# Altium footprint library SMT.PcbLib: 379 footprints (part 10 of 24)
Each footprint in its own frame and in the unit in brackets; x right, y up, seen from the top. Pads: shape width x height; smd on the part's side, far side on the other; paste and mask are expansions set on the pad; w line width, h text height; cw(c..) or ccw(c..) is an arc to the next point about the centre after c.
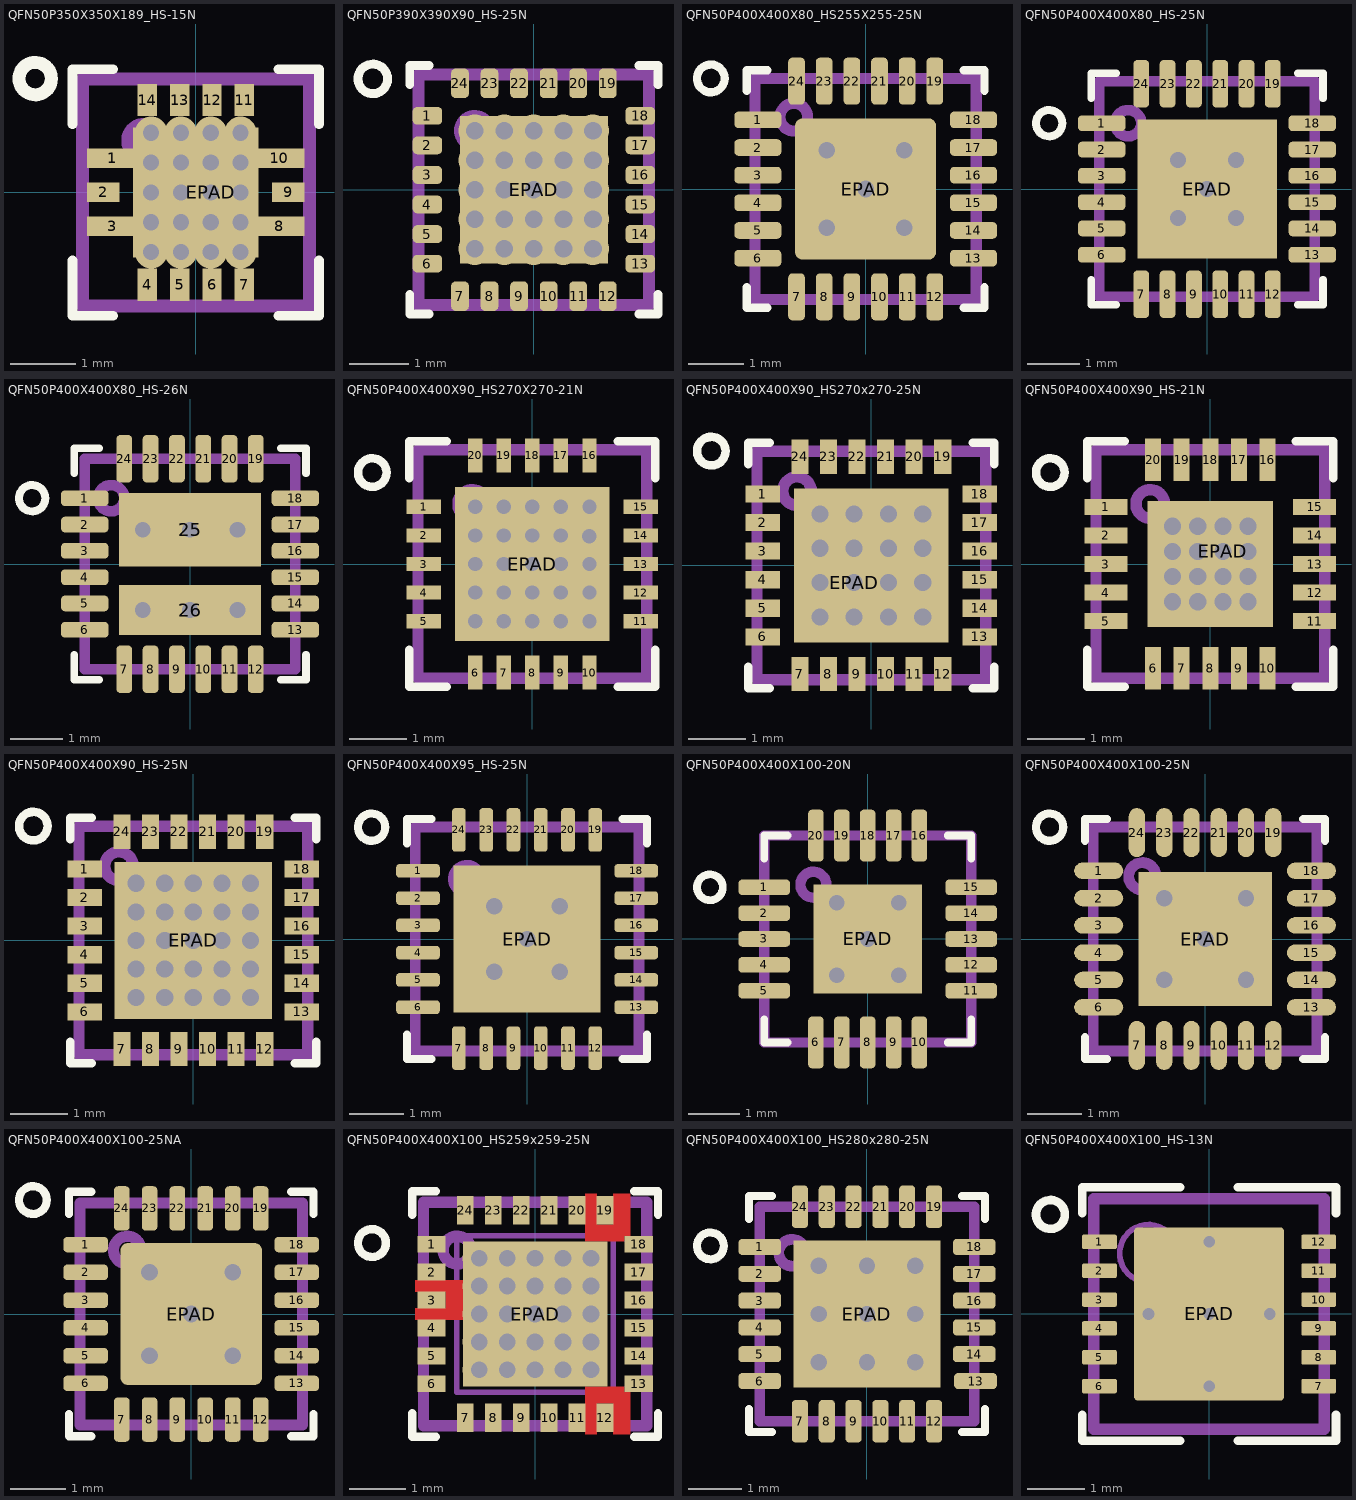
[diagram p9: the footprints below, top view; thin cyan lines are the x and y axes]

## QFN50P350X350X189_HS-15N [mm] "QFN, 14-Leads, Body 3,50x3,50mm, Pitch 0,50mm/0,53mm, Thermal Pad 1,90x2,00mm, IPC Medium Density"
height 1.89
pads (15):
  rect 0.78x0.3 smd paste+0 mask+0.05: 1(-1.285,0.525) 3(-1.285,-0.525) 8(1.285,-0.525) 10(1.285,0.525)
  rect 0.5x0.3 smd paste+0 mask+0.05: 2(-1.425,0) 9(1.425,0)
  rect 0.3x0.5 smd paste+0 mask+0.05: 4(-0.75,-1.425) 5(-0.25,-1.425) 6(0.25,-1.425) 7(0.75,-1.425) 11(0.75,1.425) 12(0.25,1.425) 13(-0.25,1.425) 14(-0.75,1.425)
  rect 1.93x2 hole 0.25 copper offset -0.23,0 mask+0.05: EPAD(0.23,0)
via 0.69,0.92 diameter 0.5 hole 0.25
via 0.23,0.92 diameter 0.5 hole 0.25
via -0.23,0.92 diameter 0.5 hole 0.25
via -0.69,0.92 diameter 0.5 hole 0.25
via 0.69,-0.92 diameter 0.5 hole 0.25
via 0.23,-0.92 diameter 0.5 hole 0.25
via -0.23,-0.92 diameter 0.5 hole 0.25
via -0.69,-0.92 diameter 0.5 hole 0.25
via -0.69,-0.46 diameter 0.5 hole 0.25
via 0.69,-0.46 diameter 0.5 hole 0.25
via 0.23,-0.46 diameter 0.5 hole 0.25
via -0.23,-0.46 diameter 0.5 hole 0.25
via -0.69,0.46 diameter 0.5 hole 0.25
via -0.23,0.46 diameter 0.5 hole 0.25
via 0.23,0.46 diameter 0.5 hole 0.25
via 0.69,0.46 diameter 0.5 hole 0.25
via 0.69,0 diameter 0.5 hole 0.25
via -0.69,0 diameter 0.5 hole 0.25
via -0.23,0 diameter 0.5 hole 0.25
Top Overlay:
  circle w0.2: c-2.476,1.755 r0.25
  lines w0.15: -1.9,-1.05 -1.9,-1.9 -1.275,-1.9 ; -1.9,1.05 -1.9,1.9 -1.275,1.9 ; 1.275,-1.9 1.9,-1.9 1.9,-1.05 ; 1.275,1.9 1.9,1.9 1.9,1.05
Top Paste:
  rectangle: -0.25,-0.25 0.25,0.25
  rectangle: -0.9,-0.25 -0.4,0.25
  region: 0.9,0.25 0.4,0.25 0.4,-0.25 0.9,-0.25
  region: -0.25,0.9 -0.25,0.4 0.25,0.4 0.25,0.9
  region: 0.25,-0.9 0.25,-0.4 -0.25,-0.4 -0.25,-0.9
  region: -0.9,0.9 -0.9,0.4 -0.4,0.4 -0.4,0.9
  region: 0.4,0.9 0.4,0.4 0.9,0.4 0.9,0.9
  region: 0.9,-0.9 0.9,-0.4 0.4,-0.4 0.4,-0.9
  region: -0.4,-0.9 -0.4,-0.4 -0.9,-0.4 -0.9,-0.9
Mechanical 1:
  circle w0.2: c-0.8,0.8 r0.25
  lines w0.2: -1.75,-1.75 1.75,-1.75 1.75,1.75 -1.75,1.75 -1.75,-1.75
Mechanical 20:
  text "см. рекомендации /  в datasheet /  /  /  /  / прошивка  / под 0.5 oz Cu и RO4003C (0.008\")" at -4.9,-5.775 h1.5
3D body "QFN50P350X350X189_HS-15N.step": height 1.89, standoff 0, extent -1.75,-1.75 1.75,1.75

## QFN50P390X390X90_HS-25N [mm] "QFN, 24-Leads, Body 3,90x3,90mm, Pitch 0,50mm, Thermal Pad 2,50x2,50mm, IPC Medium Density"
height 0.9
pads (25):
  rrect50% 0.5x0.3 smd mask+0.05: 1(-1.8,1.25) 2(-1.8,0.75) 3(-1.8,0.25) 4(-1.8,-0.25) 5(-1.8,-0.75) 6(-1.8,-1.25) 13(1.8,-1.25) 14(1.8,-0.75) 15(1.8,-0.25) 16(1.8,0.25) 17(1.8,0.75) 18(1.8,1.25)
  rrect50% 0.3x0.5 smd mask+0.05: 7(-1.25,-1.8) 8(-0.75,-1.8) 9(-0.25,-1.8) 10(0.25,-1.8) 11(0.75,-1.8) 12(1.25,-1.8) 19(1.25,1.8) 20(0.75,1.8) 21(0.25,1.8) 22(-0.25,1.8) 23(-0.75,1.8) 24(-1.25,1.8)
  rect 2.5x2.5 hole 0.3 mask+0.05: EPAD(0,0)
via 1,-1 diameter 0.55 hole 0.3
via 0.5,-1 diameter 0.55 hole 0.3
via 0,-1 diameter 0.55 hole 0.3
via -0.5,-1 diameter 0.55 hole 0.3
via -1,-1 diameter 0.55 hole 0.3
via -1,-0.5 diameter 0.55 hole 0.3
via -1,1 diameter 0.55 hole 0.3
via -0.5,1 diameter 0.55 hole 0.3
via 0,1 diameter 0.55 hole 0.3
via -0.5,-0.5 diameter 0.55 hole 0.3
via 0,-0.5 diameter 0.55 hole 0.3
via 0.5,-0.5 diameter 0.55 hole 0.3
via 1,-0.5 diameter 0.55 hole 0.3
via 0.5,1 diameter 0.55 hole 0.3
via 1,1 diameter 0.55 hole 0.3
via 1,0 diameter 0.55 hole 0.3
via 0.5,0 diameter 0.55 hole 0.3
via 1,0.5 diameter 0.55 hole 0.3
via 0.5,0.5 diameter 0.55 hole 0.3
via 0,0.5 diameter 0.55 hole 0.3
via -1,0.5 diameter 0.55 hole 0.3
via -0.5,0.5 diameter 0.55 hole 0.3
via -1,0 diameter 0.55 hole 0.3
via -0.5,0 diameter 0.55 hole 0.3
Top Overlay:
  circle w0.15: c-2.725,1.875 r0.25
  lines w0.15: -2.1,-1.775 -2.1,-2.1 -1.775,-2.1 ; -2.1,1.775 -2.1,2.1 -1.775,2.1 ; 1.775,-2.1 2.1,-2.1 2.1,-1.775 ; 1.775,2.1 2.1,2.1 2.1,1.775
Top Paste:
  rectangle: -0.75,-0.75 0.75,0.75
Mechanical 1:
  circle w0.2: c-1,1 r0.25
  lines w0.2: -1.95,-1.95 -1.95,1.95 1.95,1.95 1.95,-1.95 -1.95,-1.95
3D body "QFN50P390X390X90_HS-25N.step": height 0.9, standoff 0, extent -1.95,-1.95 1.95,1.95

## QFN50P400X400X80_HS255X255-25N [mm] "QFN, 24-Leads, Body 4,00x4,00mm, Pitch 0,50mm, Thermal Pad 2,55x2,55mm, IPC Medium Density"
height 0.8
pads (25):
  rrect50% 0.85x0.3 smd mask+0.04: 1(-1.95,1.25) 2(-1.95,0.75) 3(-1.95,0.25) 4(-1.95,-0.25) 5(-1.95,-0.75) 6(-1.95,-1.25) 13(1.95,-1.25) 14(1.95,-0.75) 15(1.95,-0.25) 16(1.95,0.25) 17(1.95,0.75) 18(1.95,1.25)
  rrect50% 0.3x0.85 smd mask+0.04: 7(-1.25,-1.95) 8(-0.75,-1.95) 9(-0.25,-1.95) 10(0.25,-1.95) 11(0.75,-1.95) 12(1.25,-1.95) 19(1.25,1.95) 20(0.75,1.95) 21(0.25,1.95) 22(-0.25,1.95) 23(-0.75,1.95) 24(-1.25,1.95)
  rrect10% 2.55x2.55 hole 0.3 mask+0.05: EPAD(0,0)
via 0.7,0.7 diameter 0.7 hole 0.3
via -0.7,0.7 diameter 0.7 hole 0.3
via -0.7,-0.7 diameter 0.7 hole 0.3
via 0.7,-0.7 diameter 0.7 hole 0.3
Top Overlay:
  circle w0.15: c-2.8,2 r0.25
  lines w0.15: -2.15,-1.775 -2.15,-2.15 -1.775,-2.15 ; -2.15,1.775 -2.15,2.15 -1.775,2.15 ; 1.775,-2.15 2.15,-2.15 2.15,-1.775 ; 1.775,2.15 2.15,2.15 2.15,1.775
Top Paste:
  rectangle: -1,-1 1,1
Mechanical 1:
  circle w0.2: c-1.3,1.3 r0.25
  lines w0.2: -2,-2 2,-2 2,2 -2,2 -2,-2
3D body "QFN50P400X400X80_HS-25N.step": height 0.8, standoff 0, extent -2.001,-2.001 2.001,2.001

## QFN50P400X400X80_HS-25N [mm] "QFN, 24-Leads, Body 4,00x4,00mm, Pitch 0,50mm, Thermal Pad 2,75x2,75mm, IPC Medium Density"
height 0.8
pads (25):
  rrect50% 0.9x0.3 smd mask+0.03: 1(-2,1.25) 2(-2,0.75) 3(-2,0.25) 4(-2,-0.25) 5(-2,-0.75) 6(-2,-1.25) 13(2,-1.25) 14(2,-0.75) 15(2,-0.25) 16(2,0.25) 17(2,0.75) 18(2,1.25)
  rrect50% 0.3x0.9 smd mask+0.03: 7(-1.25,-2) 8(-0.75,-2) 9(-0.25,-2) 10(0.25,-2) 11(0.75,-2) 12(1.25,-2) 19(1.25,2) 20(0.75,2) 21(0.25,2) 22(-0.25,2) 23(-0.75,2) 24(-1.25,2)
  rect 2.65x2.65 hole 0.3 paste-5 mask+0.05: EPAD(0,0)
via 0.55,-0.55 diameter 0.7 hole 0.3
via -0.55,-0.55 diameter 0.7 hole 0.3
via 0.55,0.55 diameter 0.7 hole 0.3
via -0.55,0.55 diameter 0.7 hole 0.3
Top Overlay:
  circle w0.15: c-3,1.25 r0.25
  lines w0.15: -2.2,-1.725 -2.2,-2.2 -1.725,-2.2 ; -2.2,1.725 -2.2,2.2 -1.725,2.2 ; 1.725,-2.2 2.2,-2.2 2.2,-1.725 ; 1.725,2.2 2.2,2.2 2.2,1.725
Top Paste:
  rectangle: -0.75,-0.75 0.75,0.75
Mechanical 1:
  circle w0.2: c-1.5,1.25 r0.25
  lines w0.2: -2.05,-2.05 2.05,-2.05 2.05,2.05 -2.05,2.05 -2.05,-2.05
3D body "User Library-QFN24_height=0_55.STEP": height 0.55, standoff 0, extent -2.01,-2.01 2.01,2.01

## QFN50P400X400X80_HS-26N [mm] "QFN, 24-Leads, Body 4,00x4,00mm, Pitch 0,50mm, Thermal Pad 2,8x1,5mm, Thermal Pad 2,8x1,05mm, IPC Medium Density"
height 0.8
pads (26):
  rrect50% 0.9x0.3 smd mask+0.03: 1(-2,1.25) 2(-2,0.75) 3(-2,0.25) 4(-2,-0.25) 5(-2,-0.75) 6(-2,-1.25) 13(2,-1.25) 14(2,-0.75) 15(2,-0.25) 16(2,0.25) 17(2,0.75) 18(2,1.25)
  rrect50% 0.3x0.9 smd mask+0.03: 7(-1.25,-2) 8(-0.75,-2) 9(-0.25,-2) 10(0.25,-2) 11(0.75,-2) 12(1.25,-2) 19(1.25,2) 20(0.75,2) 21(0.25,2) 22(-0.25,2) 23(-0.75,2) 24(-1.25,2)
  rect 2.7x1.4 hole 0.3 paste-5 mask+0.05: 25(0,0.65)
  rect 2.7x0.95 hole 0.3 paste-5 mask+0.05: 26(0,-0.875)
via 0.9,-0.875 diameter 0.7 hole 0.3
via -0.9,0.65 diameter 0.7 hole 0.3
via 0.9,0.65 diameter 0.7 hole 0.3
via -0.9,-0.875 diameter 0.7 hole 0.3
Top Overlay:
  circle w0.15: c-3,1.25 r0.25
  lines w0.15: -2.2,-1.725 -2.2,-2.2 -1.725,-2.2 ; -2.2,1.725 -2.2,2.2 -1.725,2.2 ; 1.725,-2.2 2.2,-2.2 2.2,-1.725 ; 1.725,2.2 2.2,2.2 2.2,1.725
Top Paste:
  rectangle: -1.2,0.1 1.2,1.2
  rectangle: -1.2,-1.2 1.2,-0.55
Mechanical 1:
  circle w0.2: c-1.5,1.25 r0.25
  lines w0.2: -2,-2 -2,2 2,2 2,-2 -2,-2
3D body "User Library-QFN24_height=0_55.STEP": height 0.55, standoff 0, extent -2.01,-2.01 2.01,2.01

## QFN50P400X400X90_HS270X270-21N [mm] "QFN, 20-Leads, Body 4,00x4,00mm, Pitch 0,50mm, Thermal Pad 2,7x2,7mm, IPC Medium Density"
height 0.9
pads (21):
  rect 0.6x0.25 smd mask+0.05: 1(-1.9,1) 2(-1.9,0.5) 3(-1.9,0) 4(-1.9,-0.5) 5(-1.9,-1) 11(1.9,-1) 12(1.9,-0.5) 13(1.9,0) 14(1.9,0.5) 15(1.9,1)
  rect 0.25x0.6 smd mask+0.05: 6(-1,-1.9) 7(-0.5,-1.9) 8(0,-1.9) 9(0.5,-1.9) 10(1,-1.9) 16(1,1.9) 17(0.5,1.9) 18(0,1.9) 19(-0.5,1.9) 20(-1,1.9)
  rect 2.7x2.7 hole 0.25 mask+0.05: EPAD(0,0)
via -1,-1 diameter 0.5 hole 0.25
via -1,-0.5 diameter 0.5 hole 0.25
via -1,0 diameter 0.5 hole 0.25
via -1,0.5 diameter 0.5 hole 0.25
via -1,1 diameter 0.5 hole 0.25
via 0,-0.5 diameter 0.5 hole 0.25
via -0.5,-1 diameter 0.5 hole 0.25
via 0.5,-0.5 diameter 0.5 hole 0.25
via -0.5,-0.5 diameter 0.5 hole 0.25
via 0,-1 diameter 0.5 hole 0.25
via -0.5,0 diameter 0.5 hole 0.25
via 0.5,0 diameter 0.5 hole 0.25
via 0.5,0.5 diameter 0.5 hole 0.25
via 0,0.5 diameter 0.5 hole 0.25
via -0.5,0.5 diameter 0.5 hole 0.25
via 0.5,1 diameter 0.5 hole 0.25
via 0,1 diameter 0.5 hole 0.25
via -0.5,1 diameter 0.5 hole 0.25
via 0.5,-1 diameter 0.5 hole 0.25
via 1,-1 diameter 0.5 hole 0.25
via 1,-0.5 diameter 0.5 hole 0.25
via 1,0 diameter 0.5 hole 0.25
via 0.997,0.488 diameter 0.5 hole 0.25
via 1,1 diameter 0.5 hole 0.25
Top Overlay:
  circle w0.15: c-2.8,1.6 r0.25
  lines w0.15: -2.15,-1.5 -2.15,-2.15 -1.5,-2.15 ; -2.15,1.5 -2.15,2.15 -1.5,2.15 ; 1.5,-2.15 2.15,-2.15 2.15,-1.5 ; 1.5,2.15 2.15,2.15 2.15,1.5
Top Paste:
  rectangle: -1.2,0.2 -0.2,1.2
  rectangle: -1.2,-1.2 -0.2,-0.2
  region: 1.2,1.2 0.2,1.2 0.2,0.2 1.2,0.2
  region: 1.2,-0.2 0.2,-0.2 0.2,-1.2 1.2,-1.2
Mechanical 1:
  circle w0.2: c-1.05,1.05 r0.25
  lines w0.2: -2,-2 2,-2 2,2 -2,2 -2,-2
3D body "QFN50P400X400X90_HS-21N.step": height 0.9, standoff 0, extent -2.05,-2.05 2.05,2.05

## QFN50P400X400X90_HS270x270-25N [mm] "QFN, 24-Leads, Body 4,00x4,00mm, Pitch 0,50mm, Thermal Pad 2,7x2,7mm, IPC Medium Density"
height 0.9
pads (25):
  rect 0.6x0.3 smd mask+0.04: 1(-1.9,1.25) 2(-1.9,0.75) 3(-1.9,0.25) 4(-1.9,-0.25) 5(-1.9,-0.75) 6(-1.9,-1.25) 13(1.9,-1.25) 14(1.9,-0.75) 15(1.9,-0.25) 16(1.9,0.25) 17(1.9,0.75) 18(1.9,1.25)
  rect 0.3x0.6 smd mask+0.04: 7(-1.25,-1.9) 8(-0.75,-1.9) 9(-0.25,-1.9) 10(0.25,-1.9) 11(0.75,-1.9) 12(1.25,-1.9) 19(1.25,1.9) 20(0.75,1.9) 21(0.25,1.9) 22(-0.25,1.9) 23(-0.75,1.9) 24(-1.25,1.9)
  rect 2.7x2.7 hole 0.3 copper offset 0.3,0.3 mask+0.05: EPAD(-0.3,-0.3)
via 0.3,0.3 diameter 0.6 hole 0.3
via -0.9,0.9 diameter 0.6 hole 0.3
via -0.3,0.9 diameter 0.6 hole 0.3
via 0.9,0.9 diameter 0.6 hole 0.3
via 0.3,0.9 diameter 0.6 hole 0.3
via 0.9,0.3 diameter 0.6 hole 0.3
via -0.3,0.3 diameter 0.6 hole 0.3
via -0.9,0.3 diameter 0.6 hole 0.3
via 0.3,-0.3 diameter 0.6 hole 0.3
via 0.9,-0.3 diameter 0.6 hole 0.3
via -0.9,-0.3 diameter 0.6 hole 0.3
via 0.3,-0.9 diameter 0.6 hole 0.3
via 0.9,-0.9 diameter 0.6 hole 0.3
via -0.3,-0.9 diameter 0.6 hole 0.3
via -0.9,-0.9 diameter 0.6 hole 0.3
Top Overlay:
  circle w0.15: c-2.8,2 r0.25
  lines w0.15: -2.15,-1.775 -2.15,-2.15 -1.775,-2.15 ; -2.15,1.775 -2.15,2.15 -1.775,2.15 ; 1.775,-2.15 2.15,-2.15 2.15,-1.775 ; 1.775,2.15 2.15,2.15 2.15,1.775
Top Paste:
  rectangle: -1.1,-1.1 1.1,1.1
Mechanical 1:
  circle w0.2: c-1.3,1.3 r0.25
  lines w0.2: -2,-2 2,-2 2,2 -2,2 -2,-2
3D body "QFN50P400X400X90_HS-25N.step": height 0.9, standoff 0, extent -2.05,-2.05 2.05,2.05
3D body "QFN50P400X400X90_HS-25N.step": height 0.9, standoff 0, extent -2.05,-2.05 2.05,2.05

## QFN50P400X400X90_HS-21N [mm] "QFN, 20-Leads, Body 4,00x4,00mm, Pitch 0,50mm, Thermal Pad 2,15x2,15mm, IPC Medium Density"
height 0.9
pads (21):
  rect 0.75x0.28 smd mask+0.05: 1(-1.825,1) 2(-1.825,0.5) 3(-1.825,0) 4(-1.825,-0.5) 5(-1.825,-1) 11(1.825,-1) 12(1.825,-0.5) 13(1.825,0) 14(1.825,0.5) 15(1.825,1)
  rect 0.28x0.75 smd mask+0.05: 6(-1,-1.825) 7(-0.5,-1.825) 8(0,-1.825) 9(0.5,-1.825) 10(1,-1.825) 16(1,1.825) 17(0.5,1.825) 18(0,1.825) 19(-0.5,1.825) 20(-1,1.825)
  rect 2.2x2.2 hole 0.3 copper offset -0.22,-0.22 mask+0.1: EPAD(0.22,0.22)
via 0.66,0.66 diameter 0.6 hole 0.3
via 0.66,0.22 diameter 0.6 hole 0.3
via 0.66,-0.22 diameter 0.6 hole 0.3
via 0.66,-0.66 diameter 0.6 hole 0.3
via -0.66,0.66 diameter 0.6 hole 0.3
via -0.66,0.22 diameter 0.6 hole 0.3
via -0.66,-0.22 diameter 0.6 hole 0.3
via -0.66,-0.66 diameter 0.6 hole 0.3
via -0.22,-0.66 diameter 0.6 hole 0.3
via -0.22,-0.22 diameter 0.6 hole 0.3
via -0.22,0.22 diameter 0.6 hole 0.3
via -0.22,0.66 diameter 0.6 hole 0.3
via 0.22,0.66 diameter 0.6 hole 0.3
via 0.22,-0.66 diameter 0.6 hole 0.3
via 0.22,-0.22 diameter 0.6 hole 0.3
Top Overlay:
  circle w0.15: c-2.8,1.6 r0.25
  lines w0.15: -2.15,-1.5 -2.15,-2.15 -1.5,-2.15 ; -2.15,1.5 -2.15,2.15 -1.5,2.15 ; 1.5,-2.15 2.15,-2.15 2.15,-1.5 ; 1.5,2.15 2.15,2.15 2.15,1.5
Top Paste:
  rectangle: -0.8,-0.9 0.9,0.8
Mechanical 1:
  circle w0.2: c-1.05,1.05 r0.25
  lines w0.2: -2,-2 -2,2 2,2 2,-2 -2,-2
3D body "QFN50P400X400X90_HS-21N.step": height 0.9, standoff 0, extent -2.05,-2.05 2.05,2.05

## QFN50P400X400X90_HS-25N [mm] "QFN, 24-Leads, Body 4,00x4,00mm, Pitch 0,50mm, Thermal Pad 2,75x2,75mm, IPC Medium Density"
height 0.9
pads (25):
  rect 0.6x0.3 smd mask+0.04: 1(-1.9,1.25) 2(-1.9,0.75) 3(-1.9,0.25) 4(-1.9,-0.25) 5(-1.9,-0.75) 6(-1.9,-1.25) 13(1.9,-1.25) 14(1.9,-0.75) 15(1.9,-0.25) 16(1.9,0.25) 17(1.9,0.75) 18(1.9,1.25)
  rect 0.3x0.6 smd mask+0.04: 7(-1.25,-1.9) 8(-0.75,-1.9) 9(-0.25,-1.9) 10(0.25,-1.9) 11(0.75,-1.9) 12(1.25,-1.9) 19(1.25,1.9) 20(0.75,1.9) 21(0.25,1.9) 22(-0.25,1.9) 23(-0.75,1.9) 24(-1.25,1.9)
  rect 2.75x2.75 hole 0.3 mask+0.05: EPAD(0,0)
via 0,-1 diameter 0.7 hole 0.3
via 0,-0.5 diameter 0.7 hole 0.3
via 0,0.5 diameter 0.7 hole 0.3
via 0,1 diameter 0.7 hole 0.3
via 0.5,1 diameter 0.7 hole 0.3
via 0.5,0.5 diameter 0.7 hole 0.3
via 0.5,-0.5 diameter 0.7 hole 0.3
via 0.5,-1 diameter 0.7 hole 0.3
via 0.5,0 diameter 0.7 hole 0.3
via 1,0 diameter 0.7 hole 0.3
via 1,-1 diameter 0.7 hole 0.3
via 1,-0.5 diameter 0.7 hole 0.3
via 1,0.5 diameter 0.7 hole 0.3
via 1,1 diameter 0.7 hole 0.3
via -1,1 diameter 0.7 hole 0.3
via -1,0.5 diameter 0.7 hole 0.3
via -1,-0.5 diameter 0.7 hole 0.3
via -1,-1 diameter 0.7 hole 0.3
via -1,0 diameter 0.7 hole 0.3
via -0.5,0 diameter 0.7 hole 0.3
via -0.5,-1 diameter 0.7 hole 0.3
via -0.5,-0.5 diameter 0.7 hole 0.3
via -0.5,0.5 diameter 0.7 hole 0.3
via -0.5,1 diameter 0.7 hole 0.3
Top Overlay:
  circle w0.15: c-2.8,2 r0.25
  lines w0.15: -2.15,-1.775 -2.15,-2.15 -1.775,-2.15 ; -2.15,1.775 -2.15,2.15 -1.775,2.15 ; 1.775,-2.15 2.15,-2.15 2.15,-1.775 ; 1.775,2.15 2.15,2.15 2.15,1.775
Top Paste:
  rectangle: -1.1,-1.1 1.1,1.1
Mechanical 1:
  circle w0.2: c-1.3,1.3 r0.25
  lines w0.2: -2,-2 -2,2 2,2 2,-2 -2,-2
3D body "QFN50P400X400X90_HS-25N.step": height 0.9, standoff 0, extent -2.05,-2.05 2.05,2.05

## QFN50P400X400X95_HS-25N [mm] "QFN, 24-Leads, Body 4,00x4,00mm, Pitch 0,50mm, Thermal Pad 2,70x2,70mm, IPC Medium Density"
height 0.95
pads (25):
  rrect50% 0.8x0.25 smd mask+0.05: 1(-2,1.25) 2(-2,0.75) 3(-2,0.25) 4(-2,-0.25) 5(-2,-0.75) 6(-2,-1.25) 13(2,-1.25) 14(2,-0.75) 15(2,-0.25) 16(2,0.25) 17(2,0.75) 18(2,1.25)
  rrect50% 0.25x0.8 smd mask+0.05: 7(-1.25,-2) 8(-0.75,-2) 9(-0.25,-2) 10(0.25,-2) 11(0.75,-2) 12(1.25,-2) 19(1.25,2) 20(0.75,2) 21(0.25,2) 22(-0.25,2) 23(-0.75,2) 24(-1.25,2)
  rect 2.7x2.7 hole 0.3 mask+0.05: EPAD(0,0)
via -0.6,0.6 diameter 0.7 hole 0.3
via 0.6,0.6 diameter 0.7 hole 0.3
via -0.6,-0.6 diameter 0.7 hole 0.3
via 0.6,-0.6 diameter 0.7 hole 0.3
Top Overlay:
  circle w0.15: c-2.85,2.05 r0.25
  lines w0.15: -2.2,-1.75 -2.2,-2.2 -1.75,-2.2 ; -2.2,1.75 -2.2,2.2 -1.75,2.2 ; 1.75,-2.2 2.2,-2.2 2.2,-1.75 ; 1.75,2.2 2.2,2.2 2.2,1.75
Top Paste:
  rectangle: -1,-1 1,1
Mechanical 1:
  circle w0.2: c-1.1,1.1 r0.25
  lines w0.2: -2.05,-2.05 -2.05,2.05 2.05,2.05 2.05,-2.05 -2.05,-2.05
3D body "QFN50P400X400X95_HS-25N.step": height 0.95, standoff 0, extent -2.07,-2.07 2.07,2.07

## QFN50P400X400X100-20N [mm] "QFN, 20-Leads, Body 4,0x4,0mm (max), Pitch 0,50mm, IPC Medium Density"
height 1
pads (21):
  rrect50% 1x0.3 smd mask+0.03: 1(-2,1) 2(-2,0.5) 3(-2,0) 4(-2,-0.5) 5(-2,-1) 11(2,-1) 12(2,-0.5) 13(2,0) 14(2,0.5) 15(2,1)
  rrect50% 0.3x1 smd mask+0.03: 6(-1,-2) 7(-0.5,-2) 8(0,-2) 9(0.5,-2) 10(1,-2) 16(1,2) 17(0.5,2) 18(0,2) 19(-0.5,2) 20(-1,2)
  rect 2.1x2.1 hole 0.3: EPAD(0,0)
via -0.6,0.7 diameter 0.7 hole 0.3
via 0.6,0.7 diameter 0.7 hole 0.3
via -0.6,-0.7 diameter 0.7 hole 0.3
via 0.6,-0.7 diameter 0.7 hole 0.3
Top Overlay:
  circle w0.15: c-3.05,1 r0.25
  lines w0.15: -2,-1.55 -2,-2 -1.55,-2 ; -2,1.55 -2,2 -1.55,2 ; 1.55,-2 2,-2 2,-1.55 ; 1.55,2 2,2 2,1.55
Top Paste:
  region: -0.9,0.9 -0.9,-0.9 0.9,-0.9 0.9,0.9
Mechanical 1:
  circle w0.2: c-1.05,1.05 r0.25
  lines w0.2: -2,-2 -2,2 2,2 2,-2 -2,-2
3D body "User Library-qfn20-4x4.STEP": height 0.92, standoff 0, extent -2,-2 2,2

## QFN50P400X400X100-25N [mm] "QFN, 24-Leads, Body 4,00x4,00mm, Pitch 0,50mm, Thermal Pad 2.45x2.45mm, IPC Medium Density"
height 1.2
pads (25):
  oval 0.9x0.3 smd mask+0.03: 1(-1.95,1.25) 2(-1.95,0.75) 3(-1.95,0.25) 4(-1.95,-0.25) 5(-1.95,-0.75) 6(-1.95,-1.25) 13(1.95,-1.25) 14(1.95,-0.75) 15(1.95,-0.25) 16(1.95,0.25) 17(1.95,0.75) 18(1.95,1.25)
  oval 0.3x0.9 smd mask+0.03: 7(-1.25,-1.95) 8(-0.75,-1.95) 9(-0.25,-1.95) 10(0.25,-1.95) 11(0.75,-1.95) 12(1.25,-1.95) 19(1.25,1.95) 20(0.75,1.95) 21(0.25,1.95) 22(-0.25,1.95) 23(-0.75,1.95) 24(-1.25,1.95)
  rect 2.45x2.45 hole 0.3 mask+0.1: EPAD(0,0)
via -0.75,0.75 diameter 0.7 hole 0.3
via 0.75,0.75 diameter 0.7 hole 0.3
via 0.75,-0.75 diameter 0.7 hole 0.3
via -0.75,-0.75 diameter 0.7 hole 0.3
Top Overlay:
  circle w0.15: c-2.85,2.05 r0.25
  lines w0.15: -2.2,-1.8 -2.2,-2.2 -1.8,-2.2 ; -2.2,1.8 -2.2,2.2 -1.8,2.2 ; 1.8,-2.2 2.2,-2.2 2.2,-1.8 ; 1.8,2.2 2.2,2.2 2.2,1.8
Top Paste:
  region: -0.9,0.9 -0.9,-0.9 0.9,-0.9 0.9,0.9
Mechanical 1:
  circle w0.2: c-1.15,1.15 r0.25
  lines w0.2: -2.05,-2.05 -2.05,2.05 2.05,2.05 2.05,-2.05 -2.05,-2.05
3D body "QFN24-4X4-2_1.STEP": height 0.92, standoff 0.02, extent -2,-2 2,2

## QFN50P400X400X100-25NA [mm] "QFN, 24-Leads, Body 4,00x4,00mm, Pitch 0,50mm, Thermal Pad 2.45x2.45mm, IPC Medium Density"
height 1
pads (25):
  rrect50% 0.8x0.28 smd paste+0 mask+0.05: 1(-1.9,1.25) 2(-1.9,0.75) 3(-1.9,0.25) 4(-1.9,-0.25) 5(-1.9,-0.75) 6(-1.9,-1.25) 13(1.9,-1.25) 14(1.9,-0.75) 15(1.9,-0.25) 16(1.9,0.25) 17(1.9,0.75) 18(1.9,1.25)
  rrect50% 0.28x0.8 smd paste+0 mask+0.05: 7(-1.25,-1.9) 8(-0.75,-1.9) 9(-0.25,-1.9) 10(0.25,-1.9) 11(0.75,-1.9) 12(1.25,-1.9) 19(1.25,1.9) 20(0.75,1.9) 21(0.25,1.9) 22(-0.25,1.9) 23(-0.75,1.9) 24(-1.25,1.9)
  rrect10% 2.55x2.55 hole 0.3 mask+0.05: EPAD(0,0)
via -0.75,-0.75 diameter 0.7 hole 0.3
via 0.75,-0.75 diameter 0.7 hole 0.3
via 0.75,0.75 diameter 0.7 hole 0.3
via -0.75,0.75 diameter 0.7 hole 0.3
Top Overlay:
  circle w0.15: c-2.85,2.05 r0.25
  lines w0.15: -2.2,-1.8 -2.2,-2.2 -1.8,-2.2 ; -2.2,1.8 -2.2,2.2 -1.8,2.2 ; 1.8,-2.2 2.2,-2.2 2.2,-1.8 ; 1.8,2.2 2.2,2.2 2.2,1.8
Top Paste:
  region: -1.15,-0.767 -1.15,0.767 -1.15,0.797 -1.116,0.848 -1.06,0.871 -1.001,0.859 -0.979,0.838 -0.141,0 -0.979,-0.838 -1.001,-0.859 -1.06,-0.871 -1.116,-0.848 -1.15,-0.797
  region: 0,0.141 -0.838,0.979 -0.859,1.001 -0.871,1.06 -0.848,1.116 -0.797,1.15 -0.767,1.15 0.767,1.15 0.797,1.15 0.848,1.116 0.871,1.06 0.859,1.001 0.838,0.979
  region: 0.141,0 0.979,-0.838 1.001,-0.859 1.06,-0.871 1.116,-0.848 1.15,-0.797 1.15,-0.767 1.15,0.767 1.15,0.797 1.116,0.848 1.06,0.871 1.001,0.859 0.979,0.838
  region: -0.767,-1.15 -0.797,-1.15 -0.848,-1.116 -0.871,-1.06 -0.859,-1.001 -0.838,-0.979 0,-0.141 0.838,-0.979 0.859,-1.001 0.871,-1.06 0.848,-1.116 0.797,-1.15 0.767,-1.15
Mechanical 1:
  circle w0.2: c-1.15,1.15 r0.25
  lines w0.2: -2,-2 2,-2 2,2 -2,2 -2,-2
3D body "QFN24-4X4-2_1.STEP": height 0.92, standoff 0.02, extent -2,-2 2,2

## QFN50P400X400X100_HS259x259-25N [mm] "QFN, 24-Leads, Body 4,00x4,00mm, Pitch 0,50mm, Thermal Pad 2,59x2,59mm, IPC Medium Density"
height 1
pads (25):
  rect 0.51x0.3 smd mask+0.03: 1(-1.855,1.25) 2(-1.855,0.75) 3(-1.855,0.25) 4(-1.855,-0.25) 5(-1.855,-0.75) 6(-1.855,-1.25) 13(1.855,-1.25) 14(1.855,-0.75) 15(1.855,-0.25) 16(1.855,0.25) 17(1.855,0.75) 18(1.855,1.25)
  rect 0.3x0.51 smd mask+0.03: 7(-1.25,-1.855) 8(-0.75,-1.855) 9(-0.25,-1.855) 10(0.25,-1.855) 11(0.75,-1.855) 12(1.25,-1.855) 19(1.25,1.855) 20(0.75,1.855) 21(0.25,1.855) 22(-0.25,1.855) 23(-0.75,1.855) 24(-1.25,1.855)
  rect 2.59x2.59 hole 0.3 mask+0.05: EPAD(0,0)
via 0,1 diameter 0.6 hole 0.3
via -1,1 diameter 0.6 hole 0.3
via -0.5,1 diameter 0.6 hole 0.3
via 1,1 diameter 0.6 hole 0.3
via 0.5,1 diameter 0.6 hole 0.3
via 1,0.5 diameter 0.6 hole 0.3
via 0.5,0.5 diameter 0.6 hole 0.3
via 0,0.5 diameter 0.6 hole 0.3
via -0.5,0.5 diameter 0.6 hole 0.3
via -1,0.5 diameter 0.6 hole 0.3
via -1,0 diameter 0.6 hole 0.3
via -0.5,0 diameter 0.6 hole 0.3
via 0.5,0 diameter 0.6 hole 0.3
via 1,0 diameter 0.6 hole 0.3
via 1,-0.5 diameter 0.6 hole 0.3
via 0.5,-0.5 diameter 0.6 hole 0.3
via 0,-0.5 diameter 0.6 hole 0.3
via -0.5,-0.5 diameter 0.6 hole 0.3
via -1,-0.5 diameter 0.6 hole 0.3
via -0.5,-1 diameter 0.6 hole 0.3
via 0,-1 diameter 0.6 hole 0.3
via 0.5,-1 diameter 0.6 hole 0.3
via 1,-1 diameter 0.6 hole 0.3
via -1,-1 diameter 0.6 hole 0.3
Top Layer:
  pour cut-out: -2.15,0.6 -1.3,0.6 -1.3,-0.1 -2.15,-0.1 -2.15,0.1 -1.6,0.1 -1.6,0.4 -2.15,0.4
  pour cut-out: 0.9,-2.15 0.9,-1.3 1.6,-1.3 1.6,-1.4 1.7,-1.4 1.7,-2.15 1.4,-2.15 1.4,-1.6 1.1,-1.6 1.1,-2.15
  pour cut-out: 0.9,2.15 0.9,1.3 1.6,1.3 1.6,1.4 1.7,1.4 1.7,2.15 1.4,2.15 1.4,1.6 1.1,1.6 1.1,2.15
Top Overlay:
  circle w0.15: c-2.921,1.27 r0.25
  lines w0.15: -2.2,-1.775 -2.2,-2.2 -1.775,-2.2 ; -2.2,1.775 -2.2,2.2 -1.775,2.2 ; 1.775,-2.2 2.2,-2.2 2.2,-1.775 ; 1.775,2.2 2.2,2.2 2.2,1.775
Top Paste:
  region: -1,1 -1,-1 1,-1 1,1
Mechanical 1:
  circle w0.2: c-1.397,1.143 r0.25
  lines w0.2: -2,-2 2,-2 2,2 -2,2 -2,-2
Mechanical 5:
  lines w0.1: -1.4,-1.4 1.4,-1.4 1.4,1.4 -1.4,1.4 -1.4,-1.4
Mechanical 20:
  text "Рекомендуется заполнение /  отверстий  /  (слой Mech5)" at -3.1,2.15 h1
3D body "QFN24-4X4.STEP": height 0.92, standoff 0.02, extent -2,-2 2,2

## QFN50P400X400X100_HS280x280-25N [mm] "QFN, 24-Leads, Body 4,00x4,00mm, Pitch 0,50mm, Thermal Pad 2,80x2,80mm, IPC Medium Density"
height 1
pads (25):
  rrect50% 0.8x0.3 smd paste+0 mask+0.04: 1(-2,1.25) 2(-2,0.75) 3(-2,0.25) 4(-2,-0.25) 5(-2,-0.75) 6(-2,-1.25) 13(2.025,-1.25) 14(2,-0.75) 15(2,-0.25) 16(2,0.25) 17(2,0.75) 18(2,1.25)
  rrect50% 0.3x0.8 smd paste+0 mask+0.04: 7(-1.25,-2) 8(-0.75,-2) 9(-0.25,-2) 10(0.25,-2) 11(0.75,-2) 12(1.25,-2) 19(1.25,2) 20(0.75,2) 21(0.25,2) 22(-0.25,2) 23(-0.75,2) 24(-1.25,2)
  rect 2.75x2.75 hole 0.3 mask+0.05: EPAD(0,0)
via -0.9,0 diameter 0.7 hole 0.3
via -0.9,-0.9 diameter 0.7 hole 0.3
via -0.9,0.9 diameter 0.7 hole 0.3
via 0,0.9 diameter 0.7 hole 0.3
via 0.9,0.9 diameter 0.7 hole 0.3
via 0.9,-0.9 diameter 0.7 hole 0.3
via 0,-0.9 diameter 0.7 hole 0.3
via 0.9,0 diameter 0.7 hole 0.3
Top Overlay:
  circle w0.15: c-2.921,1.27 r0.25
  lines w0.15: -2.2,-1.775 -2.2,-2.2 -1.775,-2.2 ; -2.2,1.775 -2.2,2.2 -1.775,2.2 ; 1.775,-2.2 2.2,-2.2 2.2,-1.775 ; 1.775,2.2 2.2,2.2 2.2,1.775
Top Paste:
  region: -1,1 -1,-1 1,-1 1,1
Mechanical 1:
  circle w0.2: c-1.397,1.143 r0.25
  lines w0.2: -2,-2 2,-2 2,2 -2,2 -2,-2
3D body "QFN24-4X4.STEP": height 0.92, standoff 0.02, extent -2,-2 2,2

## QFN50P400X400X100_HS-13N [mm] "QFN, 12-Leads, Body 4,00x4,00mm, Pitch 0,00mm/0,50mm, Thermal Pad 2,60x3,00mm, IPC Medium Density"
height 1
pads (13):
  rrect20% 0.6x0.25 smd paste+0 mask+0.05: 1(-1.9,1.25) 2(-1.9,0.75) 3(-1.9,0.25) 4(-1.9,-0.25) 5(-1.9,-0.75) 6(-1.9,-1.25) 7(1.9,-1.25) 8(1.9,-0.75) 9(1.9,-0.25) 10(1.9,0.25) 11(1.9,0.75) 12(1.9,1.25)
  rrect5% 2.6x3 hole 0.2: EPAD(0,0)
via 1.05,0 diameter 0.5 hole 0.2
via 0,-1.25 diameter 0.5 hole 0.2
via 0,1.25 diameter 0.5 hole 0.2
via -1.05,0 diameter 0.5 hole 0.2
Top Overlay:
  circle w0.15: c-2.75,1.725 r0.25
  lines w0.15: -2.2,-1.75 -2.2,-2.2 -0.5,-2.2 ; -2.2,1.75 -2.2,2.2 -0.5,2.2 ; 0.5,-2.2 2.2,-2.2 2.2,-1.75 ; 0.5,2.2 2.2,2.2 2.2,1.75
Top Paste:
  region: 0.1,1.25 0.1,0.275 0.1,0.242 0.125,0.182 0.172,0.135 0.232,0.11 0.265,0.11 1.18,0.11 1.21,0.11 1.265,0.133 1.307,0.175 1.33,0.23 1.33,0.26 1.33,1.26 1.33,1.29 1.307,1.345 1.265,1.387 1.21,1.41 1.18,1.41 0.26,1.41 0.228,1.41 0.169,1.386 0.124,1.341 0.1,1.282
  region: 0.1,-1.25 0.1,-0.275 0.1,-0.242 0.125,-0.182 0.172,-0.135 0.232,-0.11 0.265,-0.11 1.18,-0.11 1.21,-0.11 1.265,-0.133 1.307,-0.175 1.33,-0.23 1.33,-0.26 1.33,-1.26 1.33,-1.29 1.307,-1.345 1.265,-1.387 1.21,-1.41 1.18,-1.41 0.26,-1.41 0.228,-1.41 0.169,-1.386 0.124,-1.341 0.1,-1.282
  region: -0.1,-1.275 -0.1,-0.25 -0.1,-0.222 -0.121,-0.171 -0.161,-0.131 -0.212,-0.11 -0.24,-0.11 -1.18,-0.11 -1.21,-0.11 -1.265,-0.133 -1.307,-0.175 -1.33,-0.23 -1.33,-0.26 -1.33,-1.26 -1.33,-1.29 -1.307,-1.345 -1.265,-1.387 -1.21,-1.41 -1.18,-1.41 -0.235,-1.41 -0.208,-1.41 -0.159,-1.389 -0.121,-1.351 -0.1,-1.302
  region: -0.1,1.25 -0.1,0.275 -0.1,0.242 -0.125,0.182 -0.172,0.135 -0.232,0.11 -0.265,0.11 -1.18,0.11 -1.21,0.11 -1.265,0.133 -1.307,0.175 -1.33,0.23 -1.33,0.26 -1.33,1.26 -1.33,1.29 -1.307,1.345 -1.265,1.387 -1.21,1.41 -1.18,1.41 -0.26,1.41 -0.228,1.41 -0.169,1.386 -0.124,1.341 -0.1,1.282
Mechanical 1:
  circle w0.1: c-1.05,1.05 r0.5
  lines w0.2: -2,-2 -2,2 2,2 2,-2 -2,-2
3D body "QFN0P400X400X100_HS-13N.step": height 1, standoff 0, extent -2.08,-2 2.08,2